# Altium footprint library hdmi_lvds.PcbLib: 60 footprints (part 2 of 4)
Each footprint in its own frame and in the unit in brackets; x right, y up, seen from the top. Pads: shape width x height; smd on the part's side, far side on the other; paste and mask are expansions set on the pad; w line width, h text height; cw(c..) or ccw(c..) is an arc to the next point about the centre after c.
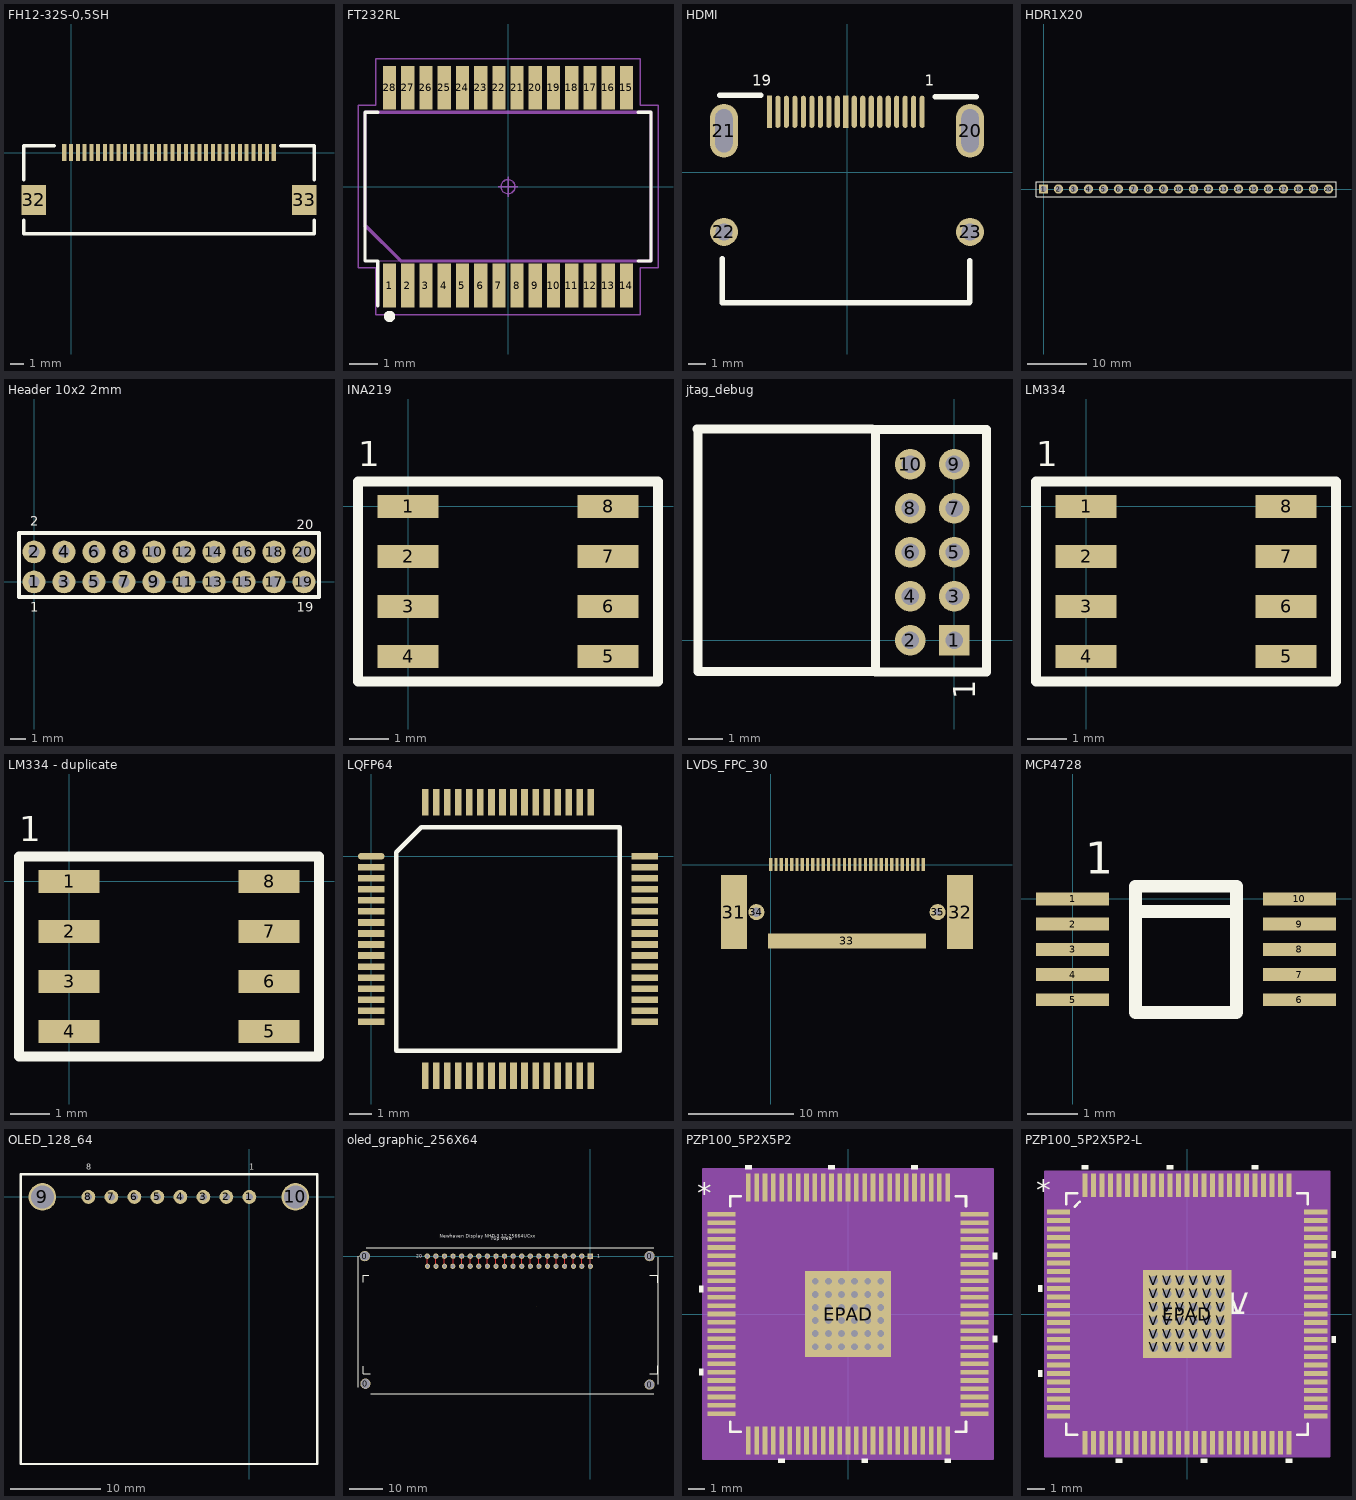
[diagram p1: the footprints below, top view; thin cyan lines are the x and y axes]

## FH12-32S-0,5SH [mm] "LVDS_FPC_30"
height 1
pads (34):
  rect 0.3x1.25 smd: 0(-0.5,0) 1(0,0) 2(0.5,0) 3(1,0) 4(1.5,0) 5(2,0) 6(2.5,0) 7(3,0) 8(3.5,0) 9(4,0) 10(4.5,0) 11(5,0) 12(5.5,0) 13(6,0) 14(6.5,0) 15(7,0) 16(7.5,0) 17(8,0) 18(8.5,0) 19(9,0) 20(9.5,0) 21(10,0) 22(10.5,0) 23(11,0) 24(11.5,0) 25(12,0) 26(12.5,0) 27(13,0) 28(13.5,0) 29(14,0) 30(14.5,0) 31(15,0)
  rect 1.8x2.2 smd: 32(-2.75,-3.5) 33(17.25,-3.5)
Top Overlay:
  lines w0.254: -3.5,-5 -3.5,-6 18,-6 18,-5 ; -3.5,-2 -3.5,0.5 -2.5,0.5 -1.25,0.5 ; 15.5,0.5 18,0.5 18,-2

## FT232RL [mm] "SOP65P780X200-28L0N, Small Outline Pkg (SOP), 0.65 mm pitch;28 pin,7.80 mm L X 5.30 mm W X 2.00 mm H body"
height 2
pads (28):
  rect 0.47x1.56 smd: 1(-4.225,-3.525) 2(-3.575,-3.525) 3(-2.925,-3.525) 4(-2.275,-3.525) 5(-1.625,-3.525) 6(-0.975,-3.525) 7(-0.325,-3.525) 8(0.325,-3.525) 9(0.975,-3.525) 10(1.625,-3.525) 11(2.275,-3.525) 12(2.925,-3.525) 13(3.575,-3.525) 14(4.225,-3.525) 15(4.225,3.525) 16(3.575,3.525) 17(2.925,3.525) 18(2.275,3.525) 19(1.625,3.525) 20(0.975,3.525) 21(0.325,3.525) 22(-0.325,3.525) 23(-0.975,3.525) 24(-1.625,3.525) 25(-2.275,3.525) 26(-2.925,3.525) 27(-3.575,3.525) 28(-4.225,3.525)
Top Overlay:
  circle w0.2: c-4.225,-4.625 r0.1
  lines w0.12: -4.64,-4.245 -4.64,-2.65 -5.1,-2.65 -5.1,2.65 -4.64,2.65 ; 4.64,-2.65 5.1,-2.65 5.1,2.65 4.64,2.65
Mechanical 11:
  lines w0.12: -5.1,-1.38 -5.1,2.65 5.1,2.65 5.1,-2.65 -3.83,-2.65 -5.1,-1.38
Mechanical 13:
  lines w0.001: -5.1,-2.65 5.1,-2.65 5.1,2.65 -5.1,2.65 -5.1,-2.65
Mechanical 15:
  circle w0.05: c0,0 r0.25
  lines w0.05: -0.35,0 0.35,0 ; 0,-0.35 0,0.35 ; -5.35,-2.9 -5.35,2.9 -4.71,2.9 -4.71,4.56 4.71,4.56 4.71,2.9 5.35,2.9 5.35,-2.9 4.71,-2.9 4.71,-4.56 -4.71,-4.56 -4.71,-2.9 -5.35,-2.9

## HDMI [mm] "HDMI normal"
height 6
pads (23):
  oval 0.3x1.9 smd: 1(4.428,3.556) 2(3.928,3.556) 3(3.428,3.556) 4(2.928,3.556) 5(2.428,3.556) 6(1.928,3.556) 7(1.428,3.556) 8(0.928,3.556) 9(0.428,3.556) 11(-0.572,3.556) 12(-1.072,3.556) 13(-1.572,3.556) 14(-2.072,3.556) 15(-2.572,3.556) 16(-3.072,3.556) 17(-3.572,3.556) 18(-4.072,3.556)
  rect 0.3x1.9 smd: 10(-0.072,3.556) 19(-4.572,3.556)
  oval 1.651x3.175 hole 1.016 slot 2.54 at 90 deg: 20(7.25,2.44) 21(-7.25,2.44)
  round 1.651 hole 1.016: 22(-7.25,-3.52) 23(7.25,-3.52)
Top Overlay:
  lines w0.33: -7.5,4.525 -5.087,4.525 ; -7.35,-5.108 -7.35,-7.7 7.2,-7.7 ; 5.207,4.445 7.62,4.445 ; 7.225,-7.65 7.225,-5.225
  text "1" at 4.572,5.08 h0.64
  text "19" at -5.588,5.08 h0.64

## HDR1X20 [mil] "Connector; Header; 20 Position"
height 100
pads (20):
  rect 62x62 hole 42: 1(0,0)
  round 62 hole 42: 2(100,0) 3(200,0) 4(300,0) 5(400,0) 6(500,0) 7(600,0) 8(700,0) 9(800,0) 10(900,0) 11(1000,0) 12(1100,0) 13(1200,0) 14(1300,0) 15(1400,0) 16(1500,0) 17(1600,0) 18(1700,0) 19(1800,0) 20(1900,0)
Top Overlay:
  lines w7.87: 1475,50 1483.33,50 ; -50,-50 1950,-50 1950,50 25,50 -50,50 -50,-50

## Header 10x2 2mm [mil] "Header 10x2 2mm"
height 5
pads (20):
  round 60 hole 30: 1(0,0) 2(0,78.74) 3(78.74,0) 4(78.74,78.74) 5(157.48,0) 6(157.48,78.74) 7(236.22,0) 8(236.22,78.74) 9(314.96,0) 10(314.96,78.74) 11(393.7,0) 12(393.7,78.74) 13(472.44,0) 14(472.44,78.74) 15(551.18,0) 16(551.18,78.74) 17(629.92,0) 18(629.92,78.74) 19(708.66,0) 20(708.66,78.74)
Top Overlay:
  lines w10: -39.37,-39.37 -39.37,127.95 748.03,127.95 748.03,-39.37 -39.37,-39.37
  text "19" at 688.98,-78.74 h25
  text "20" at 688.98,137.8 h25
  text "1" at -9.84,-78.74 h25
  text "2" at -9.84,147.64 h25

## INA219 [mil] "Current Monitor"
height 50
pads (8):
  rect 61x23 smd: 1(0,0) 2(0,-50) 3(0,-100) 4(0,-150) 5(200,-150) 6(200,-100) 7(200,-50) 8(200,0)
Top Overlay:
  lines w10: -50,-175 250,-175 250,25 -50,25 -50,-175
  text "1" at -50,40 h25

## jtag_debug [mil] "jtag_debug"
height 10
pads (10):
  rect 35x35 hole 20: 1(0,0)
  round 35 hole 20: 2(-50,0) 3(0,50) 4(-50,50) 5(0,100) 6(-50,100) 7(0,150) 8(-50,150) 9(0,200) 10(-50,200)
Top Overlay:
  lines w10: -292.32,240.16 -93.5,240.16 ; -291.34,-35.43 -291.34,238.58 ; -288.39,-35.43 -89.57,-35.43 ; -89.37,-36.22 36.61,-36.22 36.61,239.37 -89.37,239.37 -89.37,-36.22
  text "1" at 23.62,-66.93 h25

## LM334 [mil] "LM334, Current Source"
height 50
pads (8):
  rect 61x23 smd: 1(0,0) 2(0,-50) 3(0,-100) 4(0,-150) 5(200,-150) 6(200,-100) 7(200,-50) 8(200,0)
Top Overlay:
  lines w10: -50,-175 250,-175 250,25 -50,25 -50,-175
  text "1" at -50,40 h25

## LM334 - duplicate [mil] "LM334, Current Source"
height 50
pads (8):
  rect 61x23 smd: 1(0,0) 2(0,-50) 3(0,-100) 4(0,-150) 5(200,-150) 6(200,-100) 7(200,-50) 8(200,0)
Top Overlay:
  lines w10: -50,-175 -50,25 250,25 250,-175 -50,-175
  text "1" at -50,40 h25

## LQFP64 [mm] "LQPF64"
height 1.397
pads (64):
  oval 1.2x0.3 smd: 1(0,0)
  rect 1.2x0.3 smd: 2(0,-0.5) 3(0,-1) 4(0,-1.5) 5(0,-2) 6(0,-2.5) 7(0,-3) 8(0,-3.5) 9(0,-4) 10(0,-4.5) 11(0,-5) 12(0,-5.5) 13(0,-6) 14(0,-6.5) 15(0,-7) 16(0,-7.5) 33(12.4,-7.5) 34(12.4,-7) 35(12.4,-6.5) 36(12.4,-6) 37(12.4,-5.5) 38(12.4,-5) 39(12.4,-4.5) 40(12.4,-4) 41(12.4,-3.5) 42(12.4,-3) 43(12.4,-2.5) 44(12.4,-2) 45(12.4,-1.5) 46(12.4,-1) 47(12.4,-0.5) 48(12.4,0)
  rect 0.3x1.2 smd: 17(2.45,-9.95) 18(2.95,-9.95) 19(3.45,-9.95) 20(3.95,-9.95) 21(4.45,-9.95) 22(4.95,-9.95) 23(5.45,-9.95) 24(5.95,-9.95) 25(6.45,-9.95) 26(6.95,-9.95) 27(7.45,-9.95) 28(7.95,-9.95) 29(8.45,-9.95) 30(8.95,-9.95) 31(9.45,-9.95) 32(9.95,-9.95) 49(9.95,2.45) 50(9.45,2.45) 51(8.95,2.45) 52(8.45,2.45) 53(7.95,2.45) 54(7.45,2.45) 55(6.95,2.45) 56(6.45,2.45) 57(5.95,2.45) 58(5.45,2.45) 59(4.95,2.45) 60(4.45,2.45) 61(3.95,2.45) 62(3.45,2.45) 63(2.95,2.45) 64(2.45,2.45)
Top Overlay:
  lines w0.2: 1.135,-8.815 11.265,-8.815 11.265,1.315 2.27,1.315 1.135,0.18 1.135,-8.815

## LVDS_FPC_30 [mm] "LVDS_FPC_30"
height 1
pads (35):
  rect 0.3x1.25 smd: 1(0,0) 2(0.5,0) 3(1,0) 4(1.5,0) 5(2,0) 6(2.5,0) 7(3,0) 8(3.5,0) 9(4,0) 10(4.5,0) 11(5,0) 12(5.5,0) 13(6,0) 14(6.5,0) 15(7,0) 16(7.5,0) 17(8,0) 18(8.5,0) 19(9,0) 20(9.5,0) 21(10,0) 22(10.5,0) 23(11,0) 24(11.5,0) 25(12,0) 26(12.5,0) 27(13,0) 28(13.5,0) 29(14,0) 30(14.5,0)
  rect 2.47x7 smd: 31(-3.5,-4.5) 32(18,-4.5)
  rect 15x1.4 smd: 33(7.25,-7.25)
  round 1.524 hole 0.9 unplated: 34(-1.35,-4.5)
  round 1.524 hole 0.7: 35(15.85,-4.5)

## MCP4728 [mil] "12 bit, Quad DAC"
height 1
pads (10):
  rect 57x10 smd: 1(0,0) 2(0,-19.68) 3(0,-39.37) 4(0,-59.06) 5(0,-78.74) 6(177.17,-78.74) 7(177.17,-59.06) 8(177.17,-39.37) 9(177.17,-19.68) 10(177.17,0)
Top Overlay:
  lines w10: 49.21,-9.84 127.95,-9.84 ; 49.21,-88.58 49.21,9.84 127.95,9.84 127.95,-88.58 49.21,-88.58
  text "1" at 9.84,19.68 h25

## OLED_128_64 [mil] "OLED_128_64"
height 100
pads (10):
  round 60 hole 30: 1(0,0) 2(-100,0) 3(-200,0) 4(-300,0) 5(-400,0) 6(-500,0) 7(-600,0) 8(-700,0)
  round 120 hole 100: 9(-900,0) 10(200,0)
Top Overlay:
  lines w10: -994.09,-1161.42 295.28,-1161.42 295.28,98.43 -994.09,98.43 -994.09,-1161.42
  text "1" at 0,118.11 h25
  text "8" at -708.66,118.11 h25

## oled_graphic_256X64 [mil] "OLED Display graphic 256x64"
height 100
pads (44):
  round 120 hole 106.3: 0(-2627.95,0) 0(-2620.08,-1486.22) 0(688.98,-1496.06) 0(688.98,0)
  round 60 hole 39.37: 1(0,-118.11) 2(-100,-118.11) 3(-196.85,-118.11) 4(-300,-118.11) 5(-400,-118.11) 6(-500,-118.11) 7(-600,-118.11) 8(-699.21,-118.11) 9(-800,-118.11) 10(-900,-118.11) 11(-1000,-118.11) 12(-1100,-118.11) 13(-1200,-118.11) 14(-1300,-118.11) 15(-1400,-118.11) 16(-1500,-118.11) 17(-1602.36,-118.11) 18(-1700,-118.11) 19(-1799.21,-118.11) 20(-1897.64,-118.11)
  rect 62x62 hole 39.37: 1(0,0)
  round 62 hole 39.37: 2(-100,0) 3(-200,0) 4(-300,0) 5(-400,0) 6(-500,0) 7(-600,0) 8(-700,0) 9(-800,0) 10(-900,0) 11(-1000,0) 12(-1100,0) 13(-1200,0) 14(-1300,0) 15(-1400,0) 16(-1500,0) 17(-1600,0) 18(-1700,0) 19(-1800,0) 20(-1900,0)
Top Layer:
  lines w10: -1900,-107.87 -1900,0 ; -1800,-107.09 -1800,0 ; -1700,-114.96 -1700,0 ; -1600,-104.72 -1600,0 ; -1500,-118.11 -1500,0 ; -1400,-118.11 -1400,0 ; -1300,-109.45 -1300,0 ; -1200,-109.45 -1200,0 ; -1100,-104.72 -1100,0 ; -1000,-118.11 -1000,0 ; -900,-118.11 -900,0 ; -800,-118.11 -800,0 ; -700,-101.57 -700,0 ; -600,-118.11 -600,0 ; -500,-106.3 -500,0 ; -400,-118.11 -400,0 ; -300,-118.11 -300,0 ; -200,-114.96 -200,0 ; -100,-118.11 -100,0 ; 0,-118.11 0,0 ; -630.32,-589.76 -630.31,-589.76
Top Overlay:
  lines w7.87: -2707.09,-1525.59 -2707.09,-0.39 ; -2608.27,98.43 -1826.57,98.43 738.19,98.43 ; -2558.27,-1603.94 -2557.87,-1604.33 738.19,-1604.33 ; 787.4,-1492.52 787.4,-13.39
  lines w10: -2648.03,-1285.04 -2648.03,-1367.32 -2565.75,-1367.32 ; -2648.03,-305.51 -2648.03,-225.59 -2579.92,-225.59 ; 690.16,-1367.32 787.01,-1367.32 787.01,-1279.92 ; 694.09,-225.59 787.01,-225.59 787.01,-310.63
  text "Top View" at -1161.42,185.04 h39.37
  text "1" at 78.74,-19.68 h39.37
  text "20" at -2027.56,-19.68 h39.37
  text "Newhaven Display NHD-3.12-25664UCxx" at -1755.91,216.54 h39.37

## PZP100_5P2X5P2 [mil]
pads (137):
  rect 66x11 smd: 1(-300,236.22) 2(-300,216.54) 3(-300,196.85) 4(-300,177.17) 5(-300,157.48) 6(-300,137.8) 7(-300,118.11) 8(-300,98.43) 9(-300,78.74) 10(-300,59.06) 11(-300,39.37) 12(-300,19.69) 13(-300,0) 14(-300,-19.68) 15(-300,-39.37) 16(-300,-59.06) 17(-300,-78.74) 18(-300,-98.43) 19(-300,-118.11) 20(-300,-137.8) 21(-300,-157.48) 22(-300,-177.17) 23(-300,-196.85) 24(-300,-216.54) 25(-300,-236.22) 51(300,-236.22) 52(300,-216.54) 53(300,-196.85) 54(300,-177.17) 55(300,-157.48) 56(300,-137.8) 57(300,-118.11) 58(300,-98.43) 59(300,-78.74) 60(300,-59.06) 61(300,-39.37) 62(300,-19.68) 63(300,0) 64(300,19.68) 65(300,39.37) 66(300,59.06) 67(300,78.74) 68(300,98.43) 69(300,118.11) 70(300,137.8) 71(300,157.48) 72(300,177.17) 73(300,196.85) 74(300,216.54) 75(300,236.22)
  rect 11x66 smd: 26(-236.22,-300) 27(-216.54,-300) 28(-196.85,-300) 29(-177.17,-300) 30(-157.48,-300) 31(-137.8,-300) 32(-118.11,-300) 33(-98.43,-300) 34(-78.74,-300) 35(-59.06,-300) 36(-39.37,-300) 37(-19.68,-300) 38(0,-300) 39(19.68,-300) 40(39.37,-300) 41(59.06,-300) 42(78.74,-300) 43(98.43,-300) 44(118.11,-300) 45(137.8,-300) 46(157.48,-300) 47(177.17,-300) 48(196.85,-300) 49(216.54,-300) 50(236.22,-300) 76(236.22,300) 77(216.54,300) 78(196.85,300) 79(177.17,300) 80(157.48,300) 81(137.8,300) 82(118.11,300) 83(98.43,300) 84(78.74,300) 85(59.06,300) 86(39.37,300) 87(19.68,300) 88(0,300) 89(-19.68,300) 90(-39.37,300) 91(-59.06,300) 92(-78.74,300) 93(-98.43,300) 94(-118.11,300) 95(-137.8,300) 96(-157.48,300) 97(-177.17,300) 98(-196.85,300) 99(-216.54,300) 100(-236.22,300)
  round 28 hole 16: EPAD(-77.5,-77.5) EPAD(-77.5,-46.5) EPAD(-77.5,-15.5) EPAD(-77.5,15.5) EPAD(-77.5,46.5) EPAD(-77.5,77.5) EPAD(-46.5,-77.5) EPAD(-46.5,-46.5) EPAD(-46.5,-15.5) EPAD(-46.5,15.5) EPAD(-46.5,46.5) EPAD(-46.5,77.5) EPAD(-15.5,-77.5) EPAD(-15.5,-46.5) EPAD(-15.5,-15.5) EPAD(-15.5,15.5) EPAD(-15.5,46.5) EPAD(-15.5,77.5) EPAD(15.5,-77.5) EPAD(15.5,-46.5) EPAD(15.5,-15.5) EPAD(15.5,15.5) EPAD(15.5,46.5) EPAD(15.5,77.5) EPAD(46.5,-77.5) EPAD(46.5,-46.5) EPAD(46.5,-15.5) EPAD(46.5,15.5) EPAD(46.5,46.5) EPAD(46.5,77.5) EPAD(77.5,-77.5) EPAD(77.5,-46.5) EPAD(77.5,-15.5) EPAD(77.5,15.5) EPAD(77.5,46.5) EPAD(77.5,77.5)
  rect 204.72x204.72 smd paste-101.86 mask-102: EPAD(0,0)
Top Overlay:
  region: -343,66.56 -353,66.56 -353,51.56 -343,51.56
  region: -343,-130.3 -353,-130.3 -353,-145.3 -343,-145.3
  region: -149.98,-343 -164.98,-343 -164.98,-353 -149.98,-353
  region: 46.87,-343 31.87,-343 31.87,-353 46.87,-353
  region: 243.72,-343 228.72,-343 228.72,-353 243.72,-353
  region: 343,-51.56 353,-51.56 353,-66.56 343,-66.56
  region: 343,145.3 353,145.3 353,130.3 343,130.3
  region: 164.98,343 149.98,343 149.98,353 164.98,353
  region: -31.87,343 -46.87,343 -46.87,353 -31.87,353
  region: -228.72,343 -243.72,343 -243.72,353 -228.72,353
  lines w6: -279.5,-254.82 -279.5,-279.5 -254.82,-279.5 ; -279.5,254.82 -279.5,279.5 -254.82,279.5 ; 254.82,-279.5 279.5,-279.5 279.5,-254.82 ; 254.82,279.5 279.5,279.5 279.5,254.82
  text "*" at -358,261.06 h50
Top Paste:
  drawing of 49 lines, arcs and shapes, not listed
Top Solder:
  region: -104.86,85.37 -104.86,104.86 104.86,104.86 104.86,85.37
  region: -104.86,54.37 -104.86,69.63 104.86,69.63 104.86,54.37
  region: -104.86,23.37 -104.86,38.63 104.86,38.63 104.86,23.37
  region: -104.86,-7.63 -104.86,7.63 104.86,7.63 104.86,-7.63
  region: -104.86,-38.63 -104.86,-23.37 104.86,-23.37 104.86,-38.63
  region: -104.86,-69.63 -104.86,-54.37 104.86,-54.37 104.86,-69.63
  region: -104.86,-104.86 -104.86,-85.37 104.86,-85.37 104.86,-104.86
  region: -104.86,-104.86 -104.86,104.86 -85.37,104.86 -85.37,-104.86
  region: -54.37,-104.86 -54.37,104.86 -69.63,104.86 -69.63,-104.86
  region: -23.37,-104.86 -23.37,104.86 -38.63,104.86 -38.63,-104.86
  region: 7.63,-104.86 7.63,104.86 -7.63,104.86 -7.63,-104.86
  region: 38.63,-104.86 38.63,104.86 23.37,104.86 23.37,-104.86
  region: 69.63,-104.86 69.63,104.86 54.37,104.86 54.37,-104.86
  region: 85.37,-104.86 85.37,104.86 104.86,104.86 104.86,-104.86
Mechanical 13:
  text "*" at -358,261.06 h50
Mechanical 15:
  region: 343,-343 -343,-343 -343,343 343,343
  lines w6: -343,-343 -343,343 343,343 343,-343 -343,-343
3D body "PZP100_5P2X5P2.stp": height 47.1, standoff 0, extent -319,-319 319,319

## PZP100_5P2X5P2-L [mil]
pads (137):
  rect 54x11 smd: 1(-298,236.22) 2(-298,216.54) 3(-298,196.85) 4(-298,177.17) 5(-298,157.48) 6(-298,137.8) 7(-298,118.11) 8(-298,98.43) 9(-298,78.74) 10(-298,59.06) 11(-298,39.37) 12(-298,19.69) 13(-298,0) 14(-298,-19.68) 15(-298,-39.37) 16(-298,-59.06) 17(-298,-78.74) 18(-298,-98.43) 19(-298,-118.11) 20(-298,-137.8) 21(-298,-157.48) 22(-298,-177.17) 23(-298,-196.85) 24(-298,-216.54) 25(-298,-236.22) 51(298,-236.22) 52(298,-216.54) 53(298,-196.85) 54(298,-177.17) 55(298,-157.48) 56(298,-137.8) 57(298,-118.11) 58(298,-98.43) 59(298,-78.74) 60(298,-59.06) 61(298,-39.37) 62(298,-19.68) 63(298,0) 64(298,19.68) 65(298,39.37) 66(298,59.06) 67(298,78.74) 68(298,98.43) 69(298,118.11) 70(298,137.8) 71(298,157.48) 72(298,177.17) 73(298,196.85) 74(298,216.54) 75(298,236.22)
  rect 11x54 smd: 26(-236.22,-298) 27(-216.54,-298) 28(-196.85,-298) 29(-177.17,-298) 30(-157.48,-298) 31(-137.8,-298) 32(-118.11,-298) 33(-98.43,-298) 34(-78.74,-298) 35(-59.06,-298) 36(-39.37,-298) 37(-19.68,-298) 38(0,-298) 39(19.68,-298) 40(39.37,-298) 41(59.06,-298) 42(78.74,-298) 43(98.43,-298) 44(118.11,-298) 45(137.8,-298) 46(157.48,-298) 47(177.17,-298) 48(196.85,-298) 49(216.54,-298) 50(236.22,-298) 76(236.22,298) 77(216.54,298) 78(196.85,298) 79(177.17,298) 80(157.48,298) 81(137.8,298) 82(118.11,298) 83(98.43,298) 84(78.74,298) 85(59.06,298) 86(39.37,298) 87(19.68,298) 88(0,298) 89(-19.68,298) 90(-39.37,298) 91(-59.06,298) 92(-78.74,298) 93(-98.43,298) 94(-118.11,298) 95(-137.8,298) 96(-157.48,298) 97(-177.17,298) 98(-196.85,298) 99(-216.54,298) 100(-236.22,298)
  rect 204.72x204.72 smd paste-101.86 mask-102: EPAD(0,0)
  round 40 / inner round 60 / far side round 40 hole 20: V(-77.5,-77.5) V(-77.5,-46.5) V(-77.5,-15.5) V(-77.5,15.5) V(-77.5,46.5) V(-77.5,77.5) V(-46.5,-77.5) V(-46.5,-46.5) V(-46.5,-15.5) V(-46.5,15.5) V(-46.5,46.5) V(-46.5,77.5) V(-15.5,-77.5) V(-15.5,-46.5) V(-15.5,-15.5) V(-15.5,15.5) V(-15.5,46.5) V(-15.5,77.5) V(15.5,-77.5) V(15.5,-46.5) V(15.5,-15.5) V(15.5,15.5) V(15.5,46.5) V(15.5,77.5) V(46.5,-77.5) V(46.5,-46.5) V(46.5,-15.5) V(46.5,15.5) V(46.5,46.5) V(46.5,77.5) V(77.5,-77.5) V(77.5,-46.5) V(77.5,-15.5) V(77.5,15.5) V(77.5,46.5) V(77.5,77.5)
Top Overlay:
  region: -228.72,335 -243.72,335 -243.72,345 -228.72,345
  region: -31.87,335 -46.87,335 -46.87,345 -31.87,345
  region: 164.98,335 149.98,335 149.98,345 164.98,345
  region: 335,145.3 345,145.3 345,130.3 335,130.3
  region: 335,-51.56 345,-51.56 345,-66.56 335,-66.56
  region: 243.72,-335 228.72,-335 228.72,-345 243.72,-345
  region: 46.87,-335 31.87,-335 31.87,-345 46.87,-345
  region: -149.98,-335 -164.98,-335 -164.98,-345 -149.98,-345
  region: -335,-130.3 -345,-130.3 -345,-145.3 -335,-145.3
  region: -335,66.56 -345,66.56 -345,51.56 -335,51.56
  lines w6: -279.5,-254.82 -279.5,-279.5 -254.82,-279.5 ; -279.5,254.82 -279.5,279.5 -254.82,279.5 ; -260.07,248.93 -248.93,260.07 ; 254.82,-279.5 279.5,-279.5 279.5,-254.82 ; 254.82,279.5 279.5,279.5 279.5,254.82
  text "TOL" at 0,0 h50
  text "VAL" at 0,0 h50
  text "DEV" at 0,0 h50
  text "PN" at 0,0 h50
  text "*" at -350,261.06 h50
Top Paste:
  drawing of 49 lines, arcs and shapes, not listed
Top Solder:
  region: 85.37,-104.86 85.37,104.86 104.86,104.86 104.86,-104.86
  region: 69.63,-104.86 69.63,104.86 54.37,104.86 54.37,-104.86
  region: 38.63,-104.86 38.63,104.86 23.37,104.86 23.37,-104.86
  region: 7.63,-104.86 7.63,104.86 -7.63,104.86 -7.63,-104.86
  region: -23.37,-104.86 -23.37,104.86 -38.63,104.86 -38.63,-104.86
  region: -54.37,-104.86 -54.37,104.86 -69.63,104.86 -69.63,-104.86
  region: -104.86,-104.86 -104.86,104.86 -85.37,104.86 -85.37,-104.86
  region: -104.86,-104.86 -104.86,-85.37 104.86,-85.37 104.86,-104.86
  region: -104.86,-69.63 -104.86,-54.37 104.86,-54.37 104.86,-69.63
  region: -104.86,-38.63 -104.86,-23.37 104.86,-23.37 104.86,-38.63
  region: -104.86,-7.63 -104.86,7.63 104.86,7.63 104.86,-7.63
  region: -104.86,23.37 -104.86,38.63 104.86,38.63 104.86,23.37
  region: -104.86,54.37 -104.86,69.63 104.86,69.63 104.86,54.37
  region: -104.86,85.37 -104.86,104.86 104.86,104.86 104.86,85.37
Mechanical 13:
  text "RefDes2" at 0,0 h50
  text "*" at -350,261.06 h50
Mechanical 15:
  region: 329,-329 -329,-329 -329,329 329,329
  lines w6: -329,-329 329,-329 329,329 -329,329 -329,-329
3D body "PZP100_5P2X5P2-L.stp": height 47.1, standoff 0, extent -319,-319 319,319